# Altium footprint library 3.05-RJ11-RJ45-D_SUB-VGA-SCSI接口-网络变压器.PcbLib: 53 footprints (part 3 of 4)
Each footprint in its own frame and in the unit in brackets; x right, y up, seen from the top. Pads: shape width x height; smd on the part's side, far side on the other; paste and mask are expansions set on the pad; w line width, h text height; cw(c..) or ccw(c..) is an arc to the next point about the centre after c.
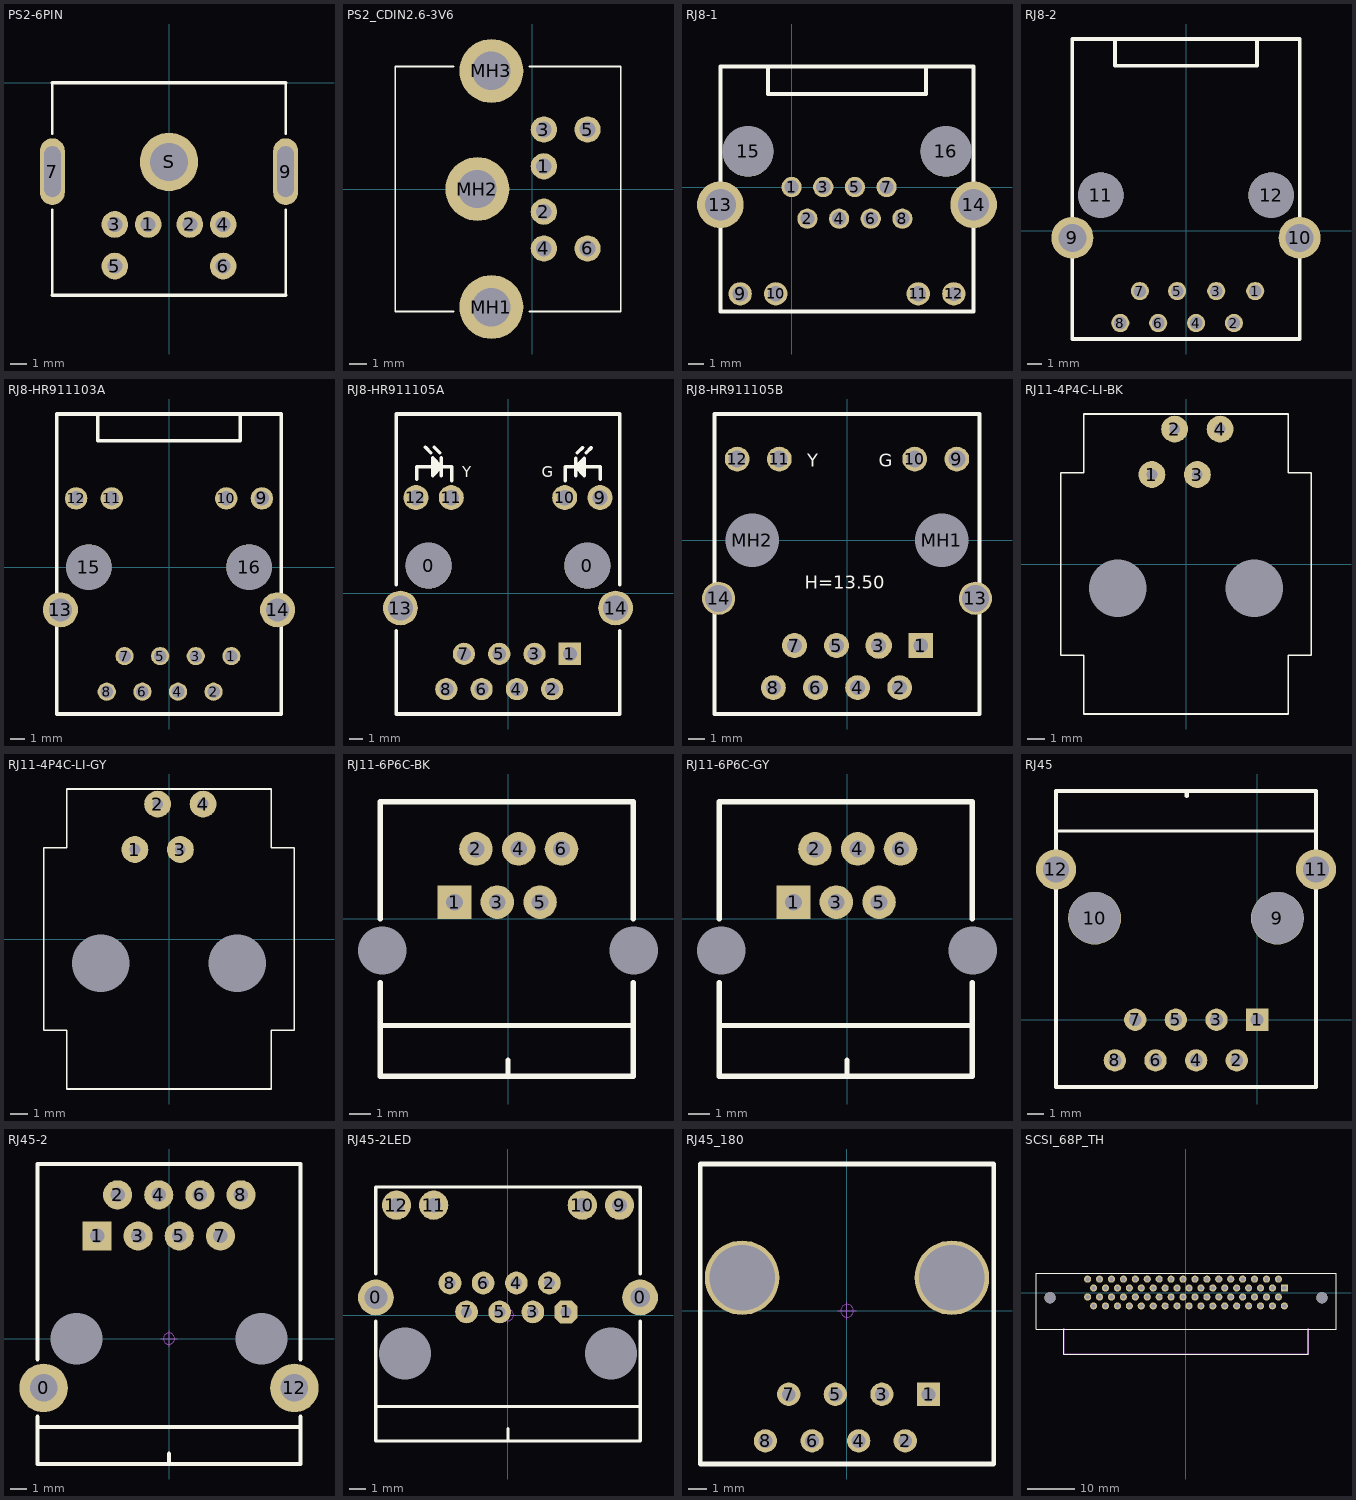
[diagram p2: the footprints below, top view; thin cyan lines are the x and y axes]

## PS2-6PIN [mm]
pads (9):
  round 1.6 hole 0.9: 1(-1.25,-8.5) 2(1.25,-8.5) 3(-3.25,-8.5) 4(3.25,-8.5) 5(-3.25,-11) 6(3.25,-11)
  oval 1.5x4 hole 1 slot 3.048 at 90 deg: 7(-7,-5.334) 9(7,-5.334)
  round 3.5 hole 2.3: S(0,-4.75)
Top Overlay:
  lines w0.152: -7,-12.75 -7,-7.62 ; -7,-3.048 -7,0 ; 7,-12.75 7,-7.62 ; 7,-3.048 7,0
  lines w0.2: -7,-12.75 7,-12.75 ; -7,0 7,0

## PS2_CDIN2.6-3V6 [mm] "Connector; Circular DIN, Thru-Hole; 6 Position; Right Angle; Pitch 2.1/2.6 mm; Body 14 x 12.9 x 13 mm (WxTxH)"
pads (9):
  round 1.5 hole 0.9: 1(0.65,1.3) 2(0.65,-1.3) 3(0.65,3.4) 4(0.65,-3.4) 5(3.15,3.4) 6(3.15,-3.4)
  round 3.65 hole 2.2: MH1(-2.35,-6.75) MH2(-3.15,0) MH3(-2.35,6.75)
Top Overlay:
  lines w0.1: -4.51,-7 -7.85,-7 -7.85,7 -4.51,7 ; -0.19,-7 5.05,-7 5.05,7 -0.19,7

## RJ8-1 [mm] "网络"
pads (16):
  round 1.3 hole 0.9: 1(0,0) 2(1.016,-2.032) 3(2.032,0) 4(3.048,-2.032) 5(4.064,0) 6(5.08,-2.032) 7(6.096,0) 8(7.112,-2.032)
  round 1.5 hole 1: 9(-3.302,-6.858) 10(-1.016,-6.858) 11(8.128,-6.858)
  round 1.5 hole 0.9: 12(10.414,-6.858)
  round 3 hole 2: 13(-4.572,-1.143) 14(11.684,-1.143)
  round 3.251 hole 3.251: 15(-2.794,2.286) 16(9.906,2.286)
Top Overlay:
  lines w0.254: -1.524,7.747 -1.524,5.969 8.636,5.969 8.636,7.747 ; -4.572,-8.001 -4.572,-1.143 -4.572,7.747 11.684,7.747 11.684,-1.143 11.684,-8.001 -4.572,-8.001

## RJ8-2 [mm] "网络"
height 10
pads (12):
  round 1.3 hole 0.9: 1(4.953,-4.318) 2(3.429,-6.604) 3(2.159,-4.318) 4(0.72,-6.604) 5(-0.635,-4.318) 6(-1.99,-6.604) 7(-3.302,-4.318) 8(-4.699,-6.604)
  round 3 hole 2: 9(-8.128,-0.508) 10(8.128,-0.508)
  round 3.251 hole 3.251: 11(-6.096,2.54) 12(6.096,2.54)
Top Overlay:
  lines w0.254: -5.08,13.589 -5.08,11.811 5.08,11.811 5.08,13.589 ; -8.128,-7.747 8.128,-7.747 8.128,-0.889 8.128,13.716 -8.128,13.716 -8.128,-0.889 -8.128,-7.747

## RJ8-HR911103A [mm] "网络"
height 10
pads (16):
  round 1.3 hole 0.9: 1(4.45,-6.35) 2(3.18,-8.89) 3(1.91,-6.35) 4(0.64,-8.89) 5(-0.63,-6.35) 6(-1.9,-8.89) 7(-3.17,-6.35) 8(-4.44,-8.89)
  round 1.6 hole 1.02: 9(6.625,4.9) 10(4.085,4.9) 11(-4.085,4.9) 12(-6.625,4.9)
  round 2.5 hole 1.63: 13(-7.745,-3.05) 14(7.745,-3.05)
  round 3.251 hole 3.251: 15(-5.715,0) 16(5.715,0)
Top Overlay:
  lines w0.254: -5.08,10.795 -5.08,9.017 5.08,9.017 5.08,10.795 ; -8,-10.48 8,-10.48 8,10.92 -8,10.92 -8,-10.48

## RJ8-HR911105A [mm] "网线接口"
pads (16):
  round 3.3 hole 3.3 unplated: 0(-5.715,1.995) 0(5.715,1.995)
  rect 1.6x1.6 hole 1: 1(4.45,-4.355)
  round 1.6 hole 1: 2(3.18,-6.895) 3(1.91,-4.355) 4(0.64,-6.895) 5(-0.63,-4.355) 6(-1.9,-6.895) 7(-3.17,-4.355) 8(-4.44,-6.895)
  round 1.8 hole 1.1: 9(6.625,6.895) 10(4.085,6.895) 11(-4.085,6.895) 12(-6.625,6.895)
  round 2.5 hole 1.8: 13(-7.745,-1.055) 14(7.745,-1.055)
Top Overlay:
  lines w0.25: -6.577,8.23 -6.577,9.119 -4.037,9.119 -4.037,8.103 ; -5.942,10.516 -5.561,10.135 ; -5.307,10.516 -4.926,10.135 ; -5.207,8.726 -5.207,9.527 ; -4.799,8.484 -4.799,9.754 ; 4.106,8.091 4.106,9.107 6.646,9.107 6.646,8.218 ; 4.868,8.472 4.868,9.742 ; 4.995,10.123 5.376,10.504 ; 5.276,8.714 5.276,9.515 ; 5.63,10.123 6.011,10.504 ; -5.434,8.484 -4.799,9.119 -5.434,9.754 -5.434,8.484 ; 4.868,9.107 5.503,8.472 5.503,9.742 4.868,9.107
  lines w0.254: -8.05,-8.685 8.05,-8.685 8.05,-2.685 ; -8.05,-8.685 -8.05,-2.685 ; -8.05,0.615 -8.05,12.915 8.05,12.915 8.05,0.615
  text "Y" at -3.302,8.345 h0.8
  text "G" at 2.413,8.345 h0.8
Mechanical 15:
  circle w0.2: c5.03,-4.96 r0.1
3D body: height 1.5, standoff -15, extent -8.001,-8.578 7.879,12.822

## RJ8-HR911105B [mm]
height 14.8
pads (16):
  rect 1.5x1.5 hole 0.9: 1(4.45,-6.35)
  round 1.5 hole 0.9: 2(3.18,-8.89) 4(0.64,-8.89) 5(-0.63,-6.35) 6(-1.9,-8.89) 7(-3.17,-6.35) 8(-4.44,-8.89)
  round 1.6 hole 0.9: 3(1.91,-6.35)
  round 1.5 hole 1.02: 9(6.625,4.9) 10(4.085,4.9) 11(-4.085,4.9) 12(-6.625,4.9)
  round 2 hole 1.63: 13(7.745,-3.5) 14(-7.745,-3.5)
  round 2.95 hole 3.25 unplated: MH1(5.715,0) MH2(-5.715,0)
Top Overlay:
  lines w0.25: -8,-10.48 -8,7.62 8,7.62 8,-10.48 -8,-10.48
  text "G" at 1.905,4.445 h0.8
  text "Y" at -2.413,4.445 h0.8
  text "H=13.50" at -2.54,-2.921 h0.8

## RJ11-4P4C-LI-BK [mm] "16.5mm*13.8mm*16.38mm(长*宽*高) 淘宝ID:黄晶宝石"
pads (6):
  round 0 hole 3.2: 0(-3.81,-1.35) 0(3.81,-1.35)
  round 1.5 hole 0.6: 1(-1.905,5) 2(-0.635,7.54) 3(0.635,5) 4(1.905,7.54)
Top Overlay:
  lines w0.1: -7,-5.1 -5.715,-5.1 -5.715,-8.382 5.715,-8.382 5.715,-5.1 7,-5.1 7,5.1 5.715,5.1 5.715,8.382 -5.715,8.382 -5.715,5.1 -7,5.1 -7,-5.1
3D body: height 16.38, standoff -3.2, extent -6.9,-8.25 6.9,8.25

## RJ11-4P4C-LI-GY [mm] "16.5mm*13.8mm*16.38mm(长*宽*高) 淘宝ID:黄晶宝石"
pads (6):
  round 0 hole 3.2: 0(-3.81,-1.35) 0(3.81,-1.35)
  round 1.5 hole 0.6: 1(-1.905,5) 2(-0.635,7.54) 3(0.635,5) 4(1.905,7.54)
Top Overlay:
  lines w0.1: -7,-5.1 -5.715,-5.1 -5.715,-8.382 5.715,-8.382 5.715,-5.1 7,-5.1 7,5.1 5.715,5.1 5.715,8.382 -5.715,8.382 -5.715,5.1 -7,5.1 -7,-5.1
3D body: height 16.38, standoff -3.2, extent -6.9,-8.25 6.9,8.25

## RJ11-6P6C-BK [mm] "12mm*12mm*14.55mm(长*宽*高) 淘宝ID:黄晶宝石"
pads (8):
  round 0 hole 2.3: 0(-6,-1.5) 0(6,-1.5)
  rect 1.6x1.6 hole 0.8: 1(-2.55,0.8)
  round 1.6 hole 0.8: 2(-1.53,3.34) 3(-0.51,0.8) 4(0.51,3.34) 5(1.53,0.8) 6(2.55,3.34)
Top Overlay:
  lines w0.254: -6.096,-5.08 5.969,-5.08 ; -6.096,-3.048 -6.096,-7.5 5.969,-7.5 5.969,-3.048 ; -6.096,0 -6.096,5.588 5.969,5.588 5.969,0 ; 0,-7.5 0,-6.731
3D body: height 14.6, standoff -3.45, extent -7.15,-7.5 7.15,5.5

## RJ11-6P6C-GY [mm] "12mm*12mm*14.55mm(长*宽*高) 淘宝ID:黄晶宝石"
pads (8):
  round 0 hole 2.3: 0(-6,-1.5) 0(6,-1.5)
  rect 1.6x1.6 hole 0.8: 1(-2.55,0.8)
  round 1.6 hole 0.8: 2(-1.53,3.34) 3(-0.51,0.8) 4(0.51,3.34) 5(1.53,0.8) 6(2.55,3.34)
Top Overlay:
  lines w0.254: -6.096,-5.08 5.969,-5.08 ; -6.096,-3.048 -6.096,-7.5 5.969,-7.5 5.969,-3.048 ; -6.096,0 -6.096,5.588 5.969,5.588 5.969,0 ; 0,-7.5 0,-6.731
3D body: height 14.6, standoff -3.45, extent -7.15,-7.5 7.15,5.5

## RJ45 [mil] "封装库来自淘宝卖家 ID：黄晶宝石"
pads (12):
  rect 55x55 hole 31.5: 1(0,0)
  round 55 hole 31.5: 2(-50,-100) 3(-100,0) 4(-150,-100) 5(-200,0) 6(-250,-100) 7(-300,0) 8(-350,-100)
  round 130 hole 127.95 unplated: 9(50,250) 10(-400,250)
  round 98.42 hole 62.99: 11(145,370) 12(-495,370)
Top Overlay:
  lines w8: -488.19,464.57 141.73,464.57
  lines w10: -495,-165.35 144.65,-165.35 145,-165 145,370 145,562.99 -495,562.99 -495,370 -495,-165 ; -173.23,551.18 -173.23,559.06
3D body: height 127.85, standoff -555.12, extent -490,-172.17 139.92,556.17

## RJ45-2 [mm] "RJ45屏蔽网络插座-短款8P"
pads (12):
  round 3 hole 1.7: 0(-7.75,-3.048) 12(7.75,-3.048)
  rect 1.8x1.8 hole 0.9: 1(-4.445,6.35)
  round 1.8 hole 0.9: 2(-3.175,8.89) 3(-1.905,6.35) 4(-0.635,8.89) 5(0.635,6.35) 6(1.905,8.89) 7(3.175,6.35) 8(4.445,8.89)
  round 0 hole 3.2 unplated: 8(-5.715,0) 9(5.715,0)
Top Overlay:
  lines w0.254: -8.128,-5.45 8.128,-5.45 ; -8.128,-4.826 -8.128,-7.747 8.128,-7.747 8.128,-4.826 ; -8.128,-1.27 -8.128,10.795 8.128,10.795 8.128,-1.27 ; 0,-7.747 0,-7.112
Mechanical 15:
  circle w0.05: c0,0 r0.35
  lines w0.05: -0.5,0 0.5,0 ; 0,-0.5 0,0.5
3D body: height 3.25, standoff -14.1, extent -7.999,-7.777 8.001,10.723

## RJ45-2LED [mm] "RJ45屏蔽网络插座带LED"
pads (16):
  round 2.2 hole 1.4: 0(-8.128,1.08)
  round 2.2 hole 1.2: 0(8.128,1.08)
  oct 1.4x1.4 hole 0.7: 1(3.57,0.19)
  round 1.4 hole 0.7: 2(2.55,1.97) 3(1.53,0.19) 4(0.51,1.97) 5(-0.51,0.19) 6(-1.53,1.97) 7(-2.55,0.19) 8(-3.57,1.97)
  round 0 hole 3.2 unplated: 9(-6.35,-2.363) 10(6.35,-2.363)
  round 1.8 hole 0.9 unplated: 9(6.86,6.757) 10(4.57,6.757) 11(-4.57,6.757) 12(-6.86,6.757)
Top Overlay:
  lines w0.203: -8.128,-5.626 8.128,-5.626 ; -8.128,-0.381 -8.128,-7.747 8.128,-7.747 8.128,-0.381 ; 0,-7.747 0,-6.985 ; -8.128,2.54 -8.128,7.874 8.128,7.874 8.128,2.54 ; -8.128,2.54 -8.128,2.54 ; 8.128,2.54 8.128,2.54
Mechanical 15:
  circle w0.05: c0,0 r0.35
  lines w0.05: -0.5,0 0.5,0 ; 0,-0.5 0,0.5
3D body: height 12.85, standoff -2.95, extent -7.95,-7.65 7.95,7.75

## RJ45_180 [mil] "网线接口"
height 53.15
pads (10):
  rect 50x50 hole 30: 1(175,-179.13)
  round 50 hole 30: 2(125,-279.13) 3(75,-179.13) 4(25,-279.13) 5(-25,-179.13) 6(-75,-279.13) 7(-125,-179.13) 8(-175,-279.13)
  round 160 hole 140: ""(-225,70.87) ""(225,70.87)
Top Overlay:
  lines w10: -314.96,-328.74 314.96,-328.74 314.96,314.96 -314.96,314.96 -314.96,-328.74
Mechanical 15:
  circle w1.97: c0,0 r13.78
  lines w1.97: -19.68,0 19.68,0 ; 0,-19.68 0,19.68
3D body: height 641.73, standoff -129.92, extent -305.11,-314.96 305.12,307.09

## SCSI_68P_TH [mil]
pads (70):
  rect 60x60 hole 36: 1(825,37.41)
  round 60 hole 36: 2(775,112.21) 3(725,37.41) 4(675,112.21) 5(625,37.41) 6(575,112.21) 7(525,37.41) 8(475,112.21) 9(425,37.41) 10(375,112.21) 11(325,37.41) 12(275,112.21) 13(225,37.41) 14(175,112.21) 15(125,37.41) 16(75,112.21) 17(25,37.41) 18(-25,112.21) 19(-75,37.41) 20(-125,112.21) 21(-175,37.41) 22(-225,112.21) 23(-275,37.41) 24(-325,112.21) 25(-375,37.41) 26(-425,112.21) 27(-475,37.41) 28(-525,112.21) 29(-575,37.41) 30(-625,112.21) 31(-675,37.41) 32(-725,112.21) 33(-775,37.41) 34(-825,112.21) 35(825,-112.2) 36(775,-37.4) 37(725,-112.2) 38(675,-37.4) 39(625,-112.2) 40(575,-37.4) 41(525,-112.2) 42(475,-37.4) 43(425,-112.2) 44(375,-37.4) 45(325,-112.2) 46(275,-37.4) 47(225,-112.2) 48(175,-37.4) 49(125,-112.2) 50(75,-37.4) 51(25,-112.2) 52(-25,-37.4) 53(-75,-112.2) 54(-125,-37.4) 55(-175,-112.2) 56(-225,-37.4) 57(-275,-112.2) 58(-325,-37.4) 59(-375,-112.2) 60(-425,-37.4) 61(-475,-112.2) 62(-525,-37.4) 63(-575,-112.2) 64(-625,-37.4) 65(-675,-112.2) 66(-725,-37.4) 67(-775,-112.2) 68(-825,-37.4)
  round 94.49 hole 94.49 unplated: ""(-1139.96,-43.31) ""(1139.96,-43.31)
Top Overlay:
  lines w10: -1023.62,-306.3 -1257.87,-306.3 -1257.87,163.38 1257.87,163.38 1257.87,-306.3 1023.62,-306.3 ; -1023.62,-306.3 -1023.62,-518.9 1023.62,-518.9 1023.62,-306.3 ; -1023.62,-306.3 1023.62,-306.3
Mechanical 15:
  circle w43.31: c-1139.96,-43.31 r21.65
  circle w43.31: c1139.96,-43.31 r21.65
  region: -1028.34,-301.57 -1028.34,-520.47 -1025.19,-523.62 1024.41,-523.62 1028.34,-519.68 1028.34,-301.57 1019.29,-301.57 1018.9,-514.17 -1018.9,-514.17 -1018.9,-301.57